# Altium integrated library Integrated_Circuts.IntLib: 76 symbols (part 1 of 4)
Pins are listed as number, name and electrical type; pins without a type are passive.

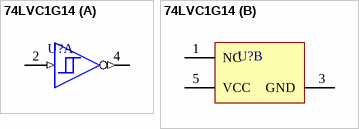
[diagram p0: symbol 74LVC1G14]

## 74LVC1G14
designator U?  (value not drawn)
footprint SOT23-5_L
footprint SOT23-5_M
footprint SOT23-5_N
footprint SOT-23-5
part A pins: 2 A (in) "Input A", 4 Y (out) "Output Y"
part B pins: 1 NC "Ground", 3 GND (power) "Ground Pin", 5 VCC (power) "Power Pin"


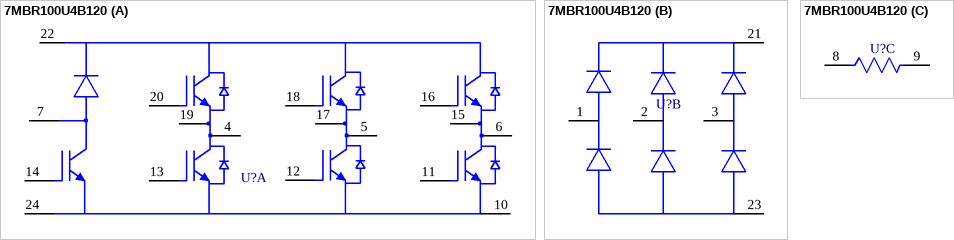
[diagram p1: symbol 7MBR100U4B120]

## 7MBR100U4B120
designator U?  (value not drawn)
footprint 7MBR100U4B120
part A pins: 4 U, 5 V, 6 W, 7 B, 10 En, 11 Gz, 12 Gy, 13 Gx, 14 Gb, 15 Ew, 16 Gw, 17 Ev, 18 Gv, 19 Eu, 20 Gu, 22 P1, 24 N1
part B pins: 1 R, 2 S, 3 T, 21 P, 23 N
part C pins: 8, 9


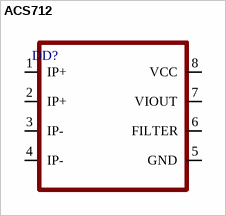
[diagram p2: symbol ACS712]

## ACS712
designator DD?
footprint SO8-150
pins: 1 IP+, 2 IP+, 3 IP-, 4 IP-, 5 GND, 6 FILTER, 7 VIOUT, 8 VCC


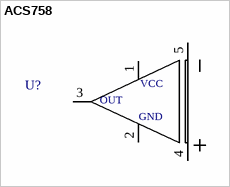
[diagram p3: symbol ACS758]

## ACS758
designator U?  (value not drawn)
footprint ACS758-100
pins: 1 +VCC, 2 GND, 3 OUT, 4 +IP, 5 -IP
text: VCC


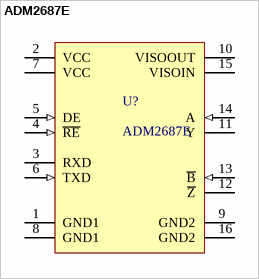
[diagram p4: symbol ADM2687E]

## ADM2687E
designator U?
footprint ADI-RI-16-2_L
footprint ADI-RI-16-2_M
footprint ADI-RI-16-2_N
footprint RI_16_2_ADI
footprint RI_16_2_ADI-L
footprint RI_16_2_ADI-M
pins: 1 GND1 (power) "Ground, Logic Side.", 2 VCC (power) "Logic Side Power Supply. It is recommended that a 0.1 µF and a 0.01 µF decoupling capacitor be fitted between Pin 2 and Pin 1.", 3 RXD (hiz) "Receiver Output Data. This output is high when (A - B) >= -30 mV and low when (A - B) <= –200 mV. The output is tristated when the receiver is disabled, that is, when R\E\ is driven high.", 4 ~{RE} (in) "Receiver Enable Input. This is an active-low input. Driving this input low enables the receiver, while driving it high disables the receiver.", 5 DE (in) "Driver Enable Input. Driving this input high enables the driver, while driving it low disables the driver.", 6 TXD (in) "Driver Input. Data to be transmitted by the driver is applied to this input.", 7 VCC (power) "Logic Side Power Supply. It is recommended that a 0.1 µF and a 10 µF decoupling capacitor be fitted between Pin 7 and Pin 8.", 8 GND1 (power) "Ground, Logic Side.", 9 GND2 (power) "Ground, Bus Side.", 10 VISOOUT (power) "Isolated Power Supply Output. This pin must be connected externally to VISOIN. It is recommended that a reservoir capacitor of 10 µF and a decoupling capacitor of 0.1 µF be fitted between Pin 10 and Pin 9.", 11 Y (hiz) "Driver Noninverting Output", 12 ~{Z} (hiz) "Driver Inverting Output", 13 ~{B} (in) "Receiver Inverting Input.", 14 A (in) "Receiver Noninverting Input.", 15 VISOIN (power) "Isolated Power Supply Input. This pin must be connected externally to VISOOUT. It is recommended that a 0.1 µF and a 0.01 µF decoupling capacitor be fitted between Pin 15 and Pin 16.", 16 GND2 (power) "Ground, Bus Side."


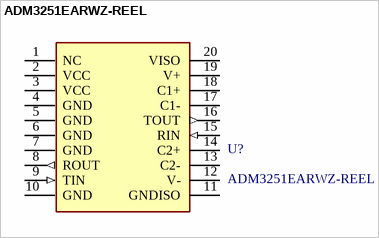
[diagram p5: symbol ADM3251EARWZ-REEL]

## ADM3251EARWZ-REEL
designator U?
DGTL ISO 2.5KV 2CH RS232 20SOIC
footprint FP-RW-20-IPC_B
footprint FP-RW-20-IPC_A
footprint FP-RW-20-IPC_C
pins: 1 NC, 2 VCC (power), 3 VCC (power), 4 GND (power), 5 GND (power), 6 GND (power), 7 GND (power), 8 ROUT (out), 9 TIN (in), 10 GND (power), 11 GNDISO (power), 12 V- (power), 13 C2-, 14 C2+, 15 RIN (in), 16 TOUT (out), 17 C1-, 18 C1+, 19 V+ (power), 20 VISO (power)


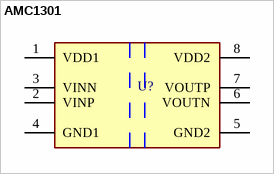
[diagram p6: symbol AMC1301]

## AMC1301
designator U?  (value not drawn)
footprint FP-DWV0008A-IPC_A
footprint FP-DWV0008A-IPC_B
footprint FP-DWV0008A-IPC_C
footprint FP-DWV0008A-MFG
pins: 1 VDD1 (power), 2 VINP (hiz), 3 VINN (hiz), 4 GND1 (power), 5 GND2 (power), 6 VOUTN, 7 VOUTP, 8 VDD2 (power)


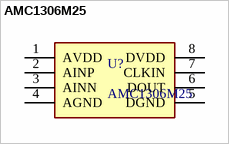
[diagram p7: symbol AMC1306M25]

## AMC1306M25
designator U?
footprint FP-DWV0008A-MFG
footprint FP-DWV0008A-IPC_A
footprint FP-DWV0008A-IPC_B
footprint FP-DWV0008A-IPC_C
pins: 1 AVDD, 2 AINP, 3 AINN, 4 AGND, 5 DGND, 6 DOUT, 7 CLKIN, 8 DVDD


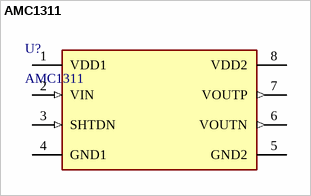
[diagram p8: symbol AMC1311]

## AMC1311
designator U?
footprint FP-DWV0008A-MFG
footprint FP-DWV0008A-IPC_C
footprint FP-DWV0008A-IPC_B
footprint FP-DWV0008A-IPC_A
pins: 1 VDD1 (power), 2 VIN (in), 3 SHTDN (in), 4 GND1 (power), 5 GND2 (power), 6 VOUTN (out), 7 VOUTP (out), 8 VDD2 (power)


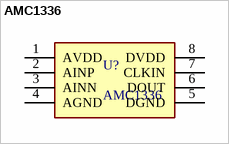
[diagram p9: symbol AMC1336]

## AMC1336
designator U?
footprint FP-DWV0008A-MFG
footprint FP-DWV0008A-IPC_A
pins: 1 AVDD, 2 AINP, 3 AINN, 4 AGND, 5 DGND, 6 DOUT, 7 CLKIN, 8 DVDD


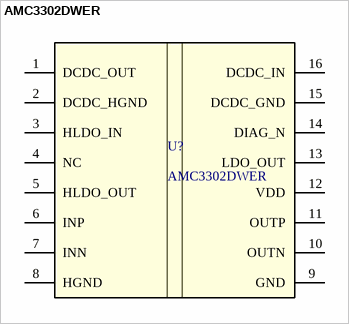
[diagram p10: symbol AMC3302DWER]

## AMC3302DWER
designator U?
±50-mV input, precision reinforced isolated amplifier with integrated DC/DC converter 16-SOIC -40 to 125
footprint DWE0016A-IPC_A
footprint DWE0016A-IPC_B
footprint DWE0016A-IPC_C
footprint DWE0016A-MFG
pins: 1 DCDC_OUT, 2 DCDC_HGND (power), 3 HLDO_IN (power), 4 NC, 5 HLDO_OUT, 6 INP (hiz), 7 INN (hiz), 8 HGND (power), 9 GND (power), 10 OUTN, 11 OUTP, 12 VDD (power), 13 LDO_OUT, 14 DIAG_N (oc), 15 DCDC_GND (power), 16 DCDC_IN (power)


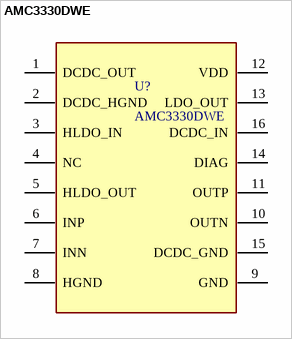
[diagram p11: symbol AMC3330DWE]

## AMC3330DWE
designator U?
footprint SOIC127P1030X265-16N
footprint FP-DW0016B-IPC_A
footprint FP-DW0016B-IPC_B
footprint FP-DW0016B-IPC_C
footprint FP-DW0016B-MFG
pins: 1 DCDC_OUT, 2 DCDC_HGND, 3 HLDO_IN, 4 NC, 5 HLDO_OUT, 6 INP, 7 INN, 8 HGND, 9 GND, 10 OUTN, 11 OUTP, 12 VDD, 13 LDO_OUT, 14 DIAG, 15 DCDC_GND, 16 DCDC_IN


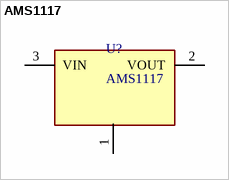
[diagram p12: symbol AMS1117]

## AMS1117
designator U?
footprint SOT-223-3
footprint SOT-223
footprint SOT-89
pins: 1 Ground (power), 2 VOUT, 3 VIN (power)


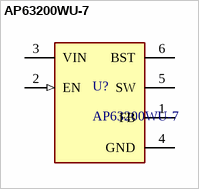
[diagram p13: symbol AP63200WU-7]

## AP63200WU-7
designator U?
AP63200WU-7  IC REG BUCK ADJUSTABLE 2A TSOT26
footprint FP-TSOT26-IPC_A
footprint FP-TSOT26-IPC_B
footprint FP-TSOT26-IPC_C
footprint FP-TSOT26-MFG
pins: 1 FB, 2 EN (in), 3 VIN (power), 4 GND (power), 5 SW, 6 BST


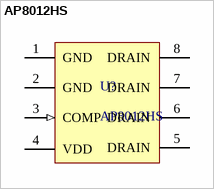
[diagram p14: symbol AP8012HS]

## AP8012HS
designator U?
footprint SOIC-8
footprint SOIC-8_L
footprint SOIC-8_M
footprint SOIC-8_N
pins: 1 GND (power), 2 GND (power), 3 COMP (in), 4 VDD (power), 5 DRAIN (power), 6 DRAIN (oc), 7 DRAIN, 8 DRAIN (power)


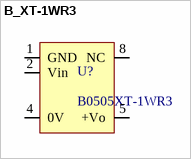
[diagram p15: symbol B_XT-1WR3]

## B_XT-1WR3
designator U?, comment B0505XT-1WR3
footprint B_XT-1WR3
pins: 1 GND, 2 Vin, 4 0V, 5 +Vo, 8 NC


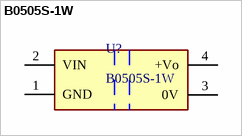
[diagram p16: symbol B0505S-1W]

## B0505S-1W
designator U?
footprint B0505S-1W
pins: 1 GND (power), 2 VIN (power), 3 0V (power), 4 +Vo (power)


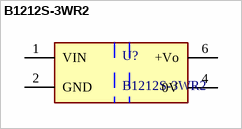
[diagram p17: symbol B1212S-3WR2]

## B1212S-3WR2
designator U?
footprint B1212S-3WR2
pins: 1 VIN (power), 2 GND (power), 4 0V (power), 6 +Vo (power)


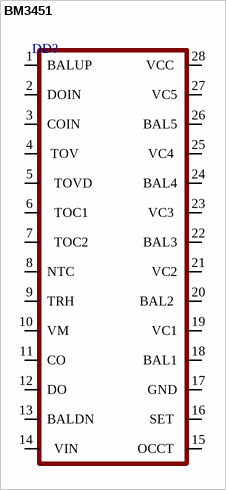
[diagram p18: symbol BM3451]

## BM3451
designator DD?
footprint TSSOP-28
pins: 1 BALUP, 2 DOIN, 3 COIN , 4  TOV, 5   TOVD, 6   TOC1, 7   TOC2, 8 NTC, 9 TRH, 10 VM, 11 CO , 12 DO, 13 BALDN, 14   VIN, 15 OCCT , 16 SET , 17 GND, 18 BAL1, 19 VC1, 20 BAL2 , 21 VC2, 22 BAL3, 23 VC3 , 24 BAL4, 25 VC4 , 26 BAL5, 27 VC5, 28 VCC 


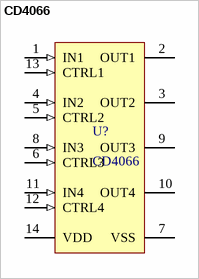
[diagram p19: symbol CD4066]

## CD4066
designator U?
Quad Analog Switch / Quad Multiplexer, 3 to 18 V, -55 to 125 degC, 14-Pin SOIC,
footprint D0014A_L
footprint D0014A_M
footprint D0014A_N
pins: 1 IN1 (in), 2 OUT1 (hiz), 3 OUT2 (hiz), 4 IN2 (in), 5 CTRL2 (in), 6 CTRL3 (in), 7 VSS (power), 8 IN3 (in), 9 OUT3 (hiz), 10 OUT4 (hiz), 11 IN4 (in), 12 CTRL4 (in), 13 CTRL1 (in), 14 VDD (power)


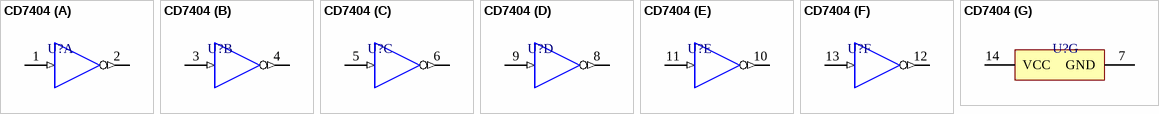
[diagram p20: symbol CD7404]

## CD7404
designator U?  (value not drawn)
footprint D0014A_L
footprint D0014A_N
footprint D0014A_M
part A pins: 1 1A (in) "Input 1A", 2 ~{1Y} (out) "Output 1Y"
part B pins: 3 2A (in) "Input 2A", 4 ~{2Y} (out) "Output 2Y"
part C pins: 5 3A (in) "Input 3A", 6 ~{3Y} (out) "Output 3Y"
part D pins: 8 ~{4Y} (out) "Output 4Y", 9 4A (in) "Input 4A"
part E pins: 10 ~{5Y} (out) "Output 5Y", 11 5A (in) "Input 5A"
part F pins: 12 ~{6Y} (out) "Output 6Y", 13 6A (in) "Input 6A"
part G pins: 7 GND (power) "Ground Pin", 14 VCC (power) "Power Pin"


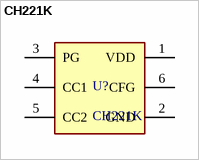
[diagram p21: symbol CH221K]

## CH221K
designator U?
WCH CH221K
footprint SOT-23-6
pins: 1 VDD (power), 2 GND, 3 PG (power), 4 CC1, 5 CC2 (power), 6 CFG (oc)


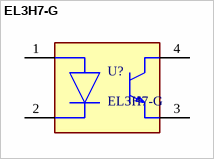
[diagram p22: symbol EL3H7-G]

## EL3H7-G
designator U?
ULTRA SMALL SSOP / PHOTOTRANSISTOR PHOTOCOUPLER
footprint EL3H7-G
pins: 1 A, 2 C, 3 E, 4 C
